# Altium footprint library Molex FFC - FPC Connectors (SMT).PcbLib: 638 footprints (part 32 of 40)
Each footprint in its own frame and in the unit in brackets; x right, y up, seen from the top. Pads: shape width x height; smd on the part's side, far side on the other; paste and mask are expansions set on the pad; w line width, h text height; cw(c..) or ccw(c..) is an arc to the next point about the centre after c.
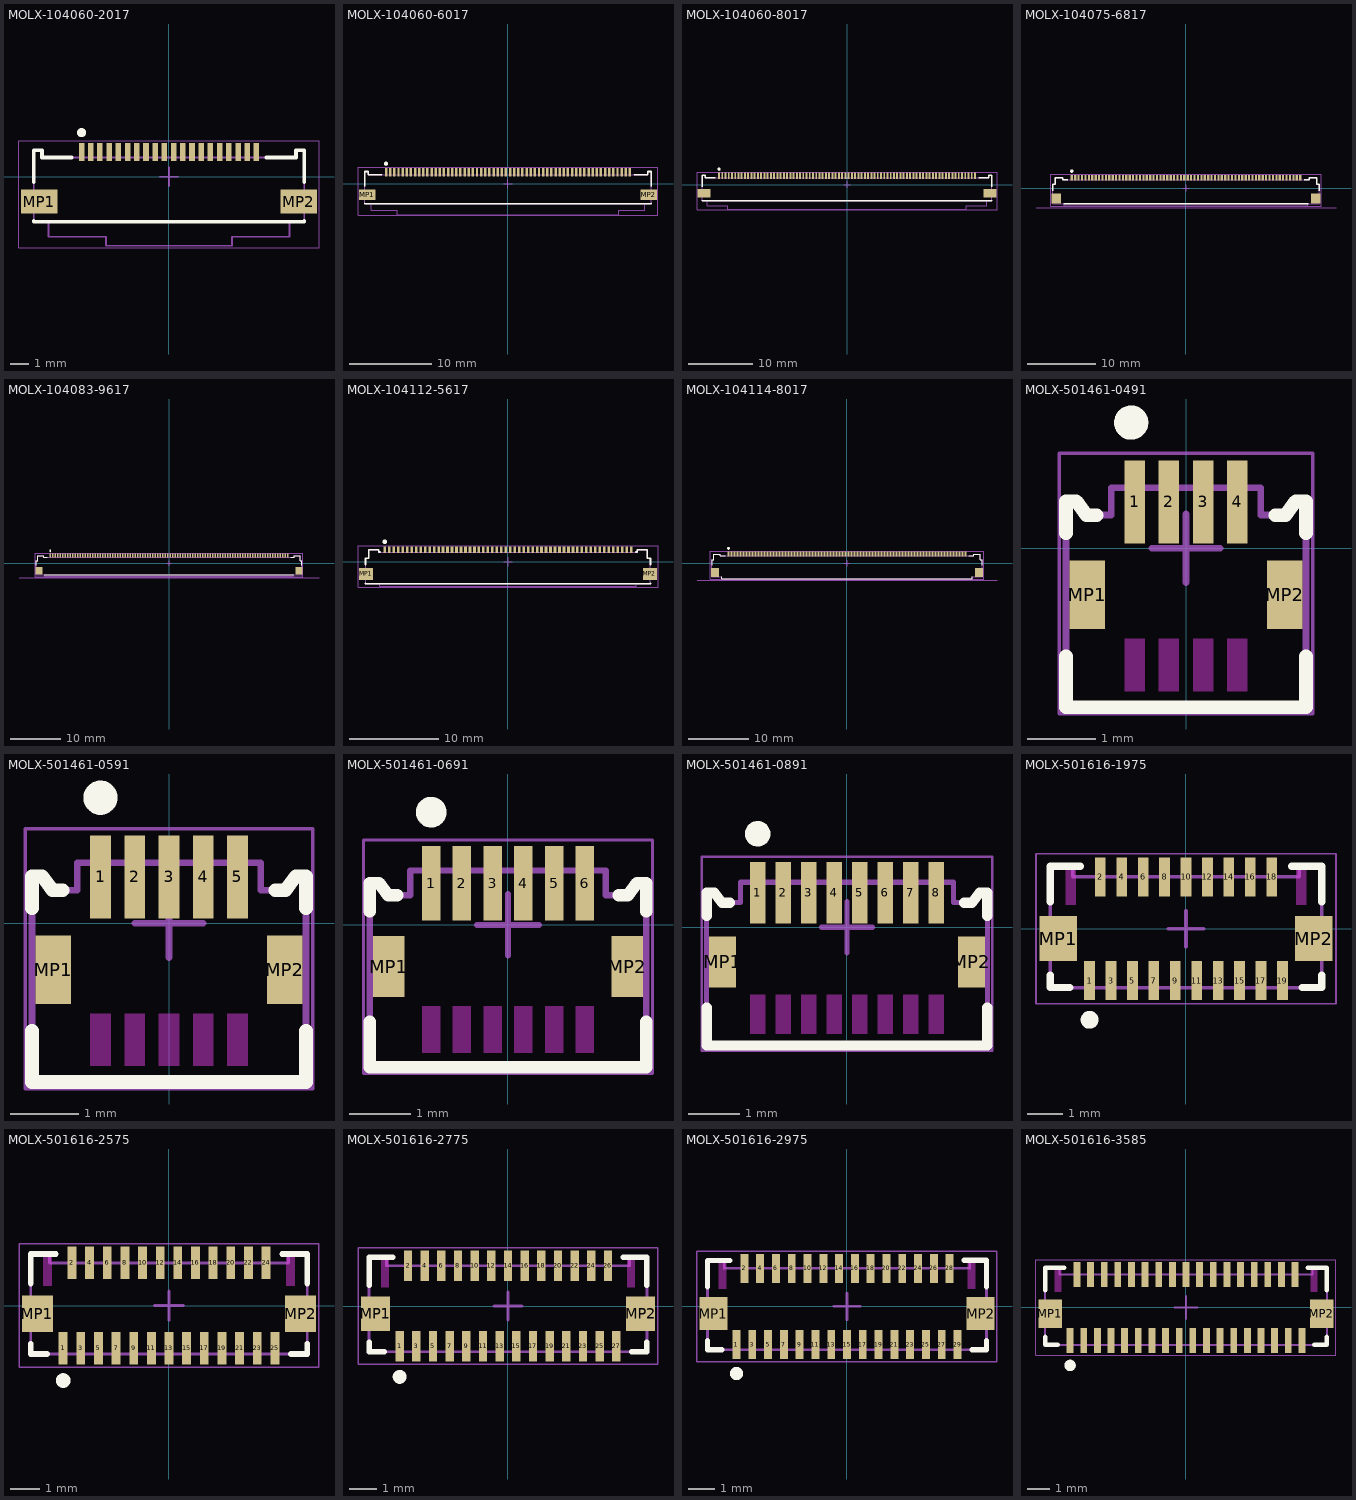
[diagram p31: the footprints below, top view; thin cyan lines are the x and y axes]

## MOLX-104060-2017 [mm] "FFC Connector, 20-Leads, Right Angle, Pitch 0.5 mm, Mated Height 2.5 mm, SMT"
height 2.55
pads (22):
  rect 0.3x1 smd: 1(-4.75,1.35) 2(-4.25,1.35) 3(-3.75,1.35) 4(-3.25,1.35) 5(-2.75,1.35) 6(-2.25,1.35) 7(-1.75,1.35) 8(-1.25,1.35) 9(-0.75,1.35) 10(-0.25,1.35) 11(0.25,1.35) 12(0.75,1.35) 13(1.25,1.35) 14(1.75,1.35) 15(2.25,1.35) 16(2.75,1.35) 17(3.25,1.35) 18(3.75,1.35) 19(4.25,1.35) 20(4.75,1.35)
  rect 2x1.3 smd: MP1(-7.05,-1.35) MP2(7.05,-1.35)
Top Overlay:
  circle w0.25: c-4.75,2.4 r0.125
  lines w0.2: -7.35,-2.4 -7.35,-2.45 7.35,-2.45 7.35,-2.4 ; -7.35,-0.3 -7.35,1.45 -6.9,1.45 -6.9,1.05 -5.3,1.05 ; 5.3,1.05 6.9,1.05 6.9,1.45 7.35,1.45 7.35,-0.3
Mechanical 13:
  lines w0.1: -6.55,-2.45 -6.55,-3.26 -3.425,-3.26 -3.425,-3.75 3.425,-3.75 3.425,-3.26 6.55,-3.26 6.55,-2.45 ; -6.55,-2.45 -7.35,-2.45 -7.35,1.45 -6.9,1.45 -6.9,1.05 6.9,1.05 6.9,1.45 7.35,1.45 7.35,-2.45 6.55,-2.45 ; -6.55,-2.45 6.55,-2.45
Mechanical 15:
  lines w0.05: -8.15,-3.85 8.15,-3.85 8.15,1.95 -8.15,1.95 -8.15,-3.85
  lines w0.1: -0.5,0 0.5,0 ; 0,-0.5 0,0.5
3D body: height 0.25, standoff 0, extent -7.75,-3.75 7.75,1.55

## MOLX-104060-6017 [mm] "FFC Connector, 60-Leads, Right Angle, Pitch 0.5 mm, Mated Height 2.5 mm, SMT"
height 2.55
pads (62):
  rect 0.3x1 smd: 1(-14.75,1.35) 2(-14.25,1.35) 3(-13.75,1.35) 4(-13.25,1.35) 5(-12.75,1.35) 6(-12.25,1.35) 7(-11.75,1.35) 8(-11.25,1.35) 9(-10.75,1.35) 10(-10.25,1.35) 11(-9.75,1.35) 12(-9.25,1.35) 13(-8.75,1.35) 14(-8.25,1.35) 15(-7.75,1.35) 16(-7.25,1.35) 17(-6.75,1.35) 18(-6.25,1.35) 19(-5.75,1.35) 20(-5.25,1.35) 21(-4.75,1.35) 22(-4.25,1.35) 23(-3.75,1.35) 24(-3.25,1.35) 25(-2.75,1.35) 26(-2.25,1.35) 27(-1.75,1.35) 28(-1.25,1.35) 29(-0.75,1.35) 30(-0.25,1.35) 31(0.25,1.35) 32(0.75,1.35) 33(1.25,1.35) 34(1.75,1.35) 35(2.25,1.35) 36(2.75,1.35) 37(3.25,1.35) 38(3.75,1.35) 39(4.25,1.35) 40(4.75,1.35) 41(5.25,1.35) 42(5.75,1.35) 43(6.25,1.35) 44(6.75,1.35) 45(7.25,1.35) 46(7.75,1.35) 47(8.25,1.35) 48(8.75,1.35) 49(9.25,1.35) 50(9.75,1.35) 51(10.25,1.35) 52(10.75,1.35) 53(11.25,1.35) 54(11.75,1.35) 55(12.25,1.35) 56(12.75,1.35) 57(13.25,1.35) 58(13.75,1.35) 59(14.25,1.35) 60(14.75,1.35)
  rect 2x1.3 smd: MP1(-17.05,-1.35) MP2(17.05,-1.35)
Top Overlay:
  circle w0.25: c-14.75,2.4 r0.125
  lines w0.2: -17.35,-2.4 -17.35,-2.45 17.35,-2.45 17.35,-2.4 ; -17.35,-0.3 -17.35,1.45 -16.9,1.45 -16.9,1.05 -15.3,1.05 ; 15.3,1.05 16.9,1.05 16.9,1.45 17.35,1.45 17.35,-0.3
Mechanical 13:
  lines w0.1: -16.55,-2.45 16.55,-2.45 ; -16.55,-2.45 -17.35,-2.45 -17.35,1.45 -16.9,1.45 -16.9,1.05 16.9,1.05 16.9,1.45 17.35,1.45 17.35,-2.45 16.55,-2.45 ; -16.55,-2.45 -16.55,-3.26 -13.425,-3.26 -13.425,-3.75 13.425,-3.75 13.425,-3.26 16.55,-3.26 16.55,-2.45
Mechanical 15:
  lines w0.05: -18.15,-3.85 18.15,-3.85 18.15,1.95 -18.15,1.95 -18.15,-3.85
  lines w0.1: -0.5,0 0.5,0 ; 0,-0.5 0,0.5
3D body: height 0.25, standoff 0, extent -17.75,-3.75 17.75,1.55

## MOLX-104060-8017 [mm] "FFC Connector, 80-Leads, Right Angle, Pitch 0.5 mm, Mated Height 2.5 mm, SMT"
height 2.55
pads (82):
  rect 0.3x1 smd: 1(-19.75,1.35) 2(-19.25,1.35) 3(-18.75,1.35) 4(-18.25,1.35) 5(-17.75,1.35) 6(-17.25,1.35) 7(-16.75,1.35) 8(-16.25,1.35) 9(-15.75,1.35) 10(-15.25,1.35) 11(-14.75,1.35) 12(-14.25,1.35) 13(-13.75,1.35) 14(-13.25,1.35) 15(-12.75,1.35) 16(-12.25,1.35) 17(-11.75,1.35) 18(-11.25,1.35) 19(-10.75,1.35) 20(-10.25,1.35) 21(-9.75,1.35) 22(-9.25,1.35) 23(-8.75,1.35) 24(-8.25,1.35) 25(-7.75,1.35) 26(-7.25,1.35) 27(-6.75,1.35) 28(-6.25,1.35) 29(-5.75,1.35) 30(-5.25,1.35) 31(-4.75,1.35) 32(-4.25,1.35) 33(-3.75,1.35) 34(-3.25,1.35) 35(-2.75,1.35) 36(-2.25,1.35) 37(-1.75,1.35) 38(-1.25,1.35) 39(-0.75,1.35) 40(-0.25,1.35) 41(0.25,1.35) 42(0.75,1.35) 43(1.25,1.35) 44(1.75,1.35) 45(2.25,1.35) 46(2.75,1.35) 47(3.25,1.35) 48(3.75,1.35) 49(4.25,1.35) 50(4.75,1.35) 51(5.25,1.35) 52(5.75,1.35) 53(6.25,1.35) 54(6.75,1.35) 55(7.25,1.35) 56(7.75,1.35) 57(8.25,1.35) 58(8.75,1.35) 59(9.25,1.35) 60(9.75,1.35) 61(10.25,1.35) 62(10.75,1.35) 63(11.25,1.35) 64(11.75,1.35) 65(12.25,1.35) 66(12.75,1.35) 67(13.25,1.35) 68(13.75,1.35) 69(14.25,1.35) 70(14.75,1.35) 71(15.25,1.35) 72(15.75,1.35) 73(16.25,1.35) 74(16.75,1.35) 75(17.25,1.35) 76(17.75,1.35) 77(18.25,1.35) 78(18.75,1.35) 79(19.25,1.35) 80(19.75,1.35)
  rect 2x1.3 smd: MP1(-22.05,-1.35) MP2(22.05,-1.35)
Top Overlay:
  circle w0.25: c-19.75,2.4 r0.125
  lines w0.2: -22.35,-2.4 -22.35,-2.45 22.35,-2.45 22.35,-2.4 ; -22.35,-0.3 -22.35,1.45 -21.9,1.45 -21.9,1.05 -20.3,1.05 ; 20.3,1.05 21.9,1.05 21.9,1.45 22.35,1.45 22.35,-0.3
Mechanical 13:
  lines w0.1: -21.55,-2.45 21.55,-2.45 ; -21.55,-2.45 -22.35,-2.45 -22.35,1.45 -21.9,1.45 -21.9,1.05 21.9,1.05 21.9,1.45 22.35,1.45 22.35,-2.45 21.55,-2.45 ; -21.55,-2.45 -21.55,-3.26 -18.425,-3.26 -18.425,-3.75 18.425,-3.75 18.425,-3.26 21.55,-3.26 21.55,-2.45
Mechanical 15:
  lines w0.05: -23.15,-3.85 -23.15,1.95 23.15,1.95 23.15,-3.85 -23.15,-3.85
  lines w0.1: -0.5,0 0.5,0 ; 0,-0.5 0,0.5
3D body: height 0.25, standoff 0, extent -22.75,-3.75 22.75,1.55

## MOLX-104075-6817 [mm] "FPC/FFC Connector, 68-Leads, Right Angle, Pitch 0.5 mm, Mated Height 1.5 mm, SMT"
height 1.5
pads (70):
  rect 0.32x0.8 smd: 1(-16.75,1.525) 2(-16.25,1.525) 3(-15.75,1.525) 4(-15.25,1.525) 5(-14.75,1.525) 6(-14.25,1.525) 7(-13.75,1.525) 8(-13.25,1.525) 9(-12.75,1.525) 10(-12.25,1.525) 11(-11.75,1.525) 12(-11.25,1.525) 13(-10.75,1.525) 14(-10.25,1.525) 15(-9.75,1.525) 16(-9.25,1.525) 17(-8.75,1.525) 18(-8.25,1.525) 19(-7.75,1.525) 20(-7.25,1.525) 21(-6.75,1.525) 22(-6.25,1.525) 23(-5.75,1.525) 24(-5.25,1.525) 25(-4.75,1.525) 26(-4.25,1.525) 27(-3.75,1.525) 28(-3.25,1.525) 29(-2.75,1.525) 30(-2.25,1.525) 31(-1.75,1.525) 32(-1.25,1.525) 33(-0.75,1.525) 34(-0.25,1.525) 35(0.25,1.525) 36(0.75,1.525) 37(1.25,1.525) 38(1.75,1.525) 39(2.25,1.525) 40(2.75,1.525) 41(3.25,1.525) 42(3.75,1.525) 43(4.25,1.525) 44(4.75,1.525) 45(5.25,1.525) 46(5.75,1.525) 47(6.25,1.525) 48(6.75,1.525) 49(7.25,1.525) 50(7.75,1.525) 51(8.25,1.525) 52(8.75,1.525) 53(9.25,1.525) 54(9.75,1.525) 55(10.25,1.525) 56(10.75,1.525) 57(11.25,1.525) 58(11.75,1.525) 59(12.25,1.525) 60(12.75,1.525) 61(13.25,1.525) 62(13.75,1.525) 63(14.25,1.525) 64(14.75,1.525) 65(15.25,1.525) 66(15.75,1.525) 67(16.25,1.525) 68(16.75,1.525)
  rect 1.4x1.5 smd: MP1(-19,-1.525) MP2(19,-1.525)
Top Overlay:
  circle w0.25: c-16.75,2.475 r0.125
  lines w0.2: -19.55,-0.375 -19.55,0.575 -19.2,0.575 -19.2,1.525 -18.09,1.525 -18.09,1.225 -17.31,1.225 ; -17.9,-2.275 -17.85,-2.275 17.85,-2.275 17.9,-2.275 ; 17.31,1.225 18.09,1.225 18.09,1.525 19.2,1.525 19.2,0.575 19.55,0.575 19.55,-0.375
Mechanical 6:
  lines w0.1: -22,-2.875 22,-2.875
  text "PCB EDGE" at -24.475,-3.025 h0.3
Mechanical 13:
  lines w0.1: -17.85,-2.275 -19.55,-2.275 -19.55,0.575 -19.2,0.575 -19.2,1.525 -18.09,1.525 -18.09,1.225 18.09,1.225 18.09,1.525 19.2,1.525 19.2,0.575 19.55,0.575 19.55,-2.275 17.85,-2.275 ; -17.85,-2.275 -17.85,-2.575 17.85,-2.575 17.85,-2.275 ; -17.85,-2.275 17.85,-2.275
Mechanical 15:
  lines w0.05: -19.8,-2.675 19.8,-2.675 19.8,2.025 -19.8,2.025 -19.8,-2.675
  lines w0.1: -0.5,0 0.5,0 ; 0,-0.5 0,0.5
3D body: height 0.25, standoff 0, extent -19.55,-2.575 19.55,1.725

## MOLX-104083-9617 [mm] "FPC/FFC Connector, 96-Leads, Right Angle, Pitch 0.5 mm, Mated Height 1.5 mm, SMT"
height 1.5
pads (98):
  rect 0.32x0.8 smd: 1(-23.75,1.525) 2(-23.25,1.525) 3(-22.75,1.525) 4(-22.25,1.525) 5(-21.75,1.525) 6(-21.25,1.525) 7(-20.75,1.525) 8(-20.25,1.525) 9(-19.75,1.525) 10(-19.25,1.525) 11(-18.75,1.525) 12(-18.25,1.525) 13(-17.75,1.525) 14(-17.25,1.525) 15(-16.75,1.525) 16(-16.25,1.525) 17(-15.75,1.525) 18(-15.25,1.525) 19(-14.75,1.525) 20(-14.25,1.525) 21(-13.75,1.525) 22(-13.25,1.525) 23(-12.75,1.525) 24(-12.25,1.525) 25(-11.75,1.525) 26(-11.25,1.525) 27(-10.75,1.525) 28(-10.25,1.525) 29(-9.75,1.525) 30(-9.25,1.525) 31(-8.75,1.525) 32(-8.25,1.525) 33(-7.75,1.525) 34(-7.25,1.525) 35(-6.75,1.525) 36(-6.25,1.525) 37(-5.75,1.525) 38(-5.25,1.525) 39(-4.75,1.525) 40(-4.25,1.525) 41(-3.75,1.525) 42(-3.25,1.525) 43(-2.75,1.525) 44(-2.25,1.525) 45(-1.75,1.525) 46(-1.25,1.525) 47(-0.75,1.525) 48(-0.25,1.525) 49(0.25,1.525) 50(0.75,1.525) 51(1.25,1.525) 52(1.75,1.525) 53(2.25,1.525) 54(2.75,1.525) 55(3.25,1.525) 56(3.75,1.525) 57(4.25,1.525) 58(4.75,1.525) 59(5.25,1.525) 60(5.75,1.525) 61(6.25,1.525) 62(6.75,1.525) 63(7.25,1.525) 64(7.75,1.525) 65(8.25,1.525) 66(8.75,1.525) 67(9.25,1.525) 68(9.75,1.525) 69(10.25,1.525) 70(10.75,1.525) 71(11.25,1.525) 72(11.75,1.525) 73(12.25,1.525) 74(12.75,1.525) 75(13.25,1.525) 76(13.75,1.525) 77(14.25,1.525) 78(14.75,1.525) 79(15.25,1.525) 80(15.75,1.525) 81(16.25,1.525) 82(16.75,1.525) 83(17.25,1.525) 84(17.75,1.525) 85(18.25,1.525) 86(18.75,1.525) 87(19.25,1.525) 88(19.75,1.525) 89(20.25,1.525) 90(20.75,1.525) 91(21.25,1.525) 92(21.75,1.525) 93(22.25,1.525) 94(22.75,1.525) 95(23.25,1.525) 96(23.75,1.525)
  rect 1.4x1.5 smd: MP1(-26,-1.525) MP2(26,-1.525)
Top Overlay:
  circle w0.25: c-23.75,2.475 r0.125
  lines w0.2: -26.55,-0.375 -26.55,0.525 -26.2,0.525 -26.2,1.525 -25.09,1.525 -25.09,1.225 -24.31,1.225 ; -24.9,-2.275 -24.85,-2.275 24.85,-2.275 24.9,-2.275 ; 24.31,1.225 25.09,1.225 25.09,1.525 26.2,1.525 26.2,0.525 26.55,0.525 26.55,-0.375
Mechanical 6:
  lines w0.1: -30,-2.875 30,-2.875
  text "PCB EDGE" at -32.75,-2.975 h0.3
Mechanical 13:
  lines w0.1: -24.85,-2.275 24.85,-2.275 ; -24.85,-2.275 -24.85,-2.575 24.85,-2.575 24.85,-2.275 ; -24.85,-2.275 -26.55,-2.275 -26.55,0.525 -26.2,0.525 -26.2,1.525 -25.09,1.525 -25.09,1.225 25.09,1.225 25.09,1.525 26.2,1.525 26.2,0.525 26.55,0.525 26.55,-2.275 24.85,-2.275
Mechanical 15:
  lines w0.05: -26.8,-2.675 -26.8,2.025 26.8,2.025 26.8,-2.675 -26.8,-2.675
  lines w0.1: -0.5,0 0.5,0 ; 0,-0.5 0,0.5
3D body: height 0.25, standoff 0, extent -26.55,-2.575 26.55,1.725

## MOLX-104112-5617 [mm] "FPC/FFC Connector, 56-Leads, Right Angle, Pitch 0.5 mm, Mated Height 1.5 mm, SMT"
height 1.5
pads (58):
  rect 0.3x0.7 smd: 1(-13.75,1.35) 2(-13.25,1.35) 3(-12.75,1.35) 4(-12.25,1.35) 5(-11.75,1.35) 6(-11.25,1.35) 7(-10.75,1.35) 8(-10.25,1.35) 9(-9.75,1.35) 10(-9.25,1.35) 11(-8.75,1.35) 12(-8.25,1.35) 13(-7.75,1.35) 14(-7.25,1.35) 15(-6.75,1.35) 16(-6.25,1.35) 17(-5.75,1.35) 18(-5.25,1.35) 19(-4.75,1.35) 20(-4.25,1.35) 21(-3.75,1.35) 22(-3.25,1.35) 23(-2.75,1.35) 24(-2.25,1.35) 25(-1.75,1.35) 26(-1.25,1.35) 27(-0.75,1.35) 28(-0.25,1.35) 29(0.25,1.35) 30(0.75,1.35) 31(1.25,1.35) 32(1.75,1.35) 33(2.25,1.35) 34(2.75,1.35) 35(3.25,1.35) 36(3.75,1.35) 37(4.25,1.35) 38(4.75,1.35) 39(5.25,1.35) 40(5.75,1.35) 41(6.25,1.35) 42(6.75,1.35) 43(7.25,1.35) 44(7.75,1.35) 45(8.25,1.35) 46(8.75,1.35) 47(9.25,1.35) 48(9.75,1.35) 49(10.25,1.35) 50(10.75,1.35) 51(11.25,1.35) 52(11.75,1.35) 53(12.25,1.35) 54(12.75,1.35) 55(13.25,1.35) 56(13.75,1.35)
  rect 1.6x1.3 smd: MP1(-15.85,-1.35) MP2(15.85,-1.35)
Top Overlay:
  circle w0.25: c-13.75,2.25 r0.125
  lines w0.2: -15.9,-2.4 -15.9,-2.45 -14.3,-2.45 14.3,-2.45 15.9,-2.45 15.9,-2.4 ; -15.9,-0.3 -15.9,0.4 -15.55,0.4 -15.55,1.35 -14.44,1.35 -14.44,1.1 -14.3,1.1 ; 14.3,1.1 14.44,1.1 14.44,1.35 15.55,1.35 15.55,0.4 15.9,0.4 15.9,-0.3
Mechanical 13:
  lines w0.1: -14.3,-2.45 -15.9,-2.45 -15.9,0.4 -15.55,0.4 -15.55,1.35 -14.44,1.35 -14.44,1.1 14.44,1.1 14.44,1.35 15.55,1.35 15.55,0.4 15.9,0.4 15.9,-2.45 14.3,-2.45 ; -14.3,-2.45 -14.3,-2.75 14.3,-2.75 14.3,-2.45 ; -14.3,-2.45 14.3,-2.45
Mechanical 15:
  lines w0.05: -16.75,-2.85 -16.75,1.8 16.75,1.8 16.75,-2.85 -16.75,-2.85
  lines w0.1: -0.5,0 0.5,0 ; 0,-0.5 0,0.5
3D body: height 0.25, standoff 0, extent -16.26,-2.75 16.26,1.6

## MOLX-104114-8017 [mm] "FPC/FFC Connector, 80-Leads, Right Angle, Pitch 0.5 mm, Mated Height 1.5 mm, SMT"
height 1.5
pads (82):
  rect 0.32x0.8 smd: 1(-19.75,1.525) 2(-19.25,1.525) 3(-18.75,1.525) 4(-18.25,1.525) 5(-17.75,1.525) 6(-17.25,1.525) 7(-16.75,1.525) 8(-16.25,1.525) 9(-15.75,1.525) 10(-15.25,1.525) 11(-14.75,1.525) 12(-14.25,1.525) 13(-13.75,1.525) 14(-13.25,1.525) 15(-12.75,1.525) 16(-12.25,1.525) 17(-11.75,1.525) 18(-11.25,1.525) 19(-10.75,1.525) 20(-10.25,1.525) 21(-9.75,1.525) 22(-9.25,1.525) 23(-8.75,1.525) 24(-8.25,1.525) 25(-7.75,1.525) 26(-7.25,1.525) 27(-6.75,1.525) 28(-6.25,1.525) 29(-5.75,1.525) 30(-5.25,1.525) 31(-4.75,1.525) 32(-4.25,1.525) 33(-3.75,1.525) 34(-3.25,1.525) 35(-2.75,1.525) 36(-2.25,1.525) 37(-1.75,1.525) 38(-1.25,1.525) 39(-0.75,1.525) 40(-0.25,1.525) 41(0.25,1.525) 42(0.75,1.525) 43(1.25,1.525) 44(1.75,1.525) 45(2.25,1.525) 46(2.75,1.525) 47(3.25,1.525) 48(3.75,1.525) 49(4.25,1.525) 50(4.75,1.525) 51(5.25,1.525) 52(5.75,1.525) 53(6.25,1.525) 54(6.75,1.525) 55(7.25,1.525) 56(7.75,1.525) 57(8.25,1.525) 58(8.75,1.525) 59(9.25,1.525) 60(9.75,1.525) 61(10.25,1.525) 62(10.75,1.525) 63(11.25,1.525) 64(11.75,1.525) 65(12.25,1.525) 66(12.75,1.525) 67(13.25,1.525) 68(13.75,1.525) 69(14.25,1.525) 70(14.75,1.525) 71(15.25,1.525) 72(15.75,1.525) 73(16.25,1.525) 74(16.75,1.525) 75(17.25,1.525) 76(17.75,1.525) 77(18.25,1.525) 78(18.75,1.525) 79(19.25,1.525) 80(19.75,1.525)
  rect 1.4x1.5 smd: MP1(-22,-1.525) MP2(22,-1.525)
Top Overlay:
  circle w0.25: c-19.75,2.475 r0.125
  lines w0.2: -22.55,-0.375 -22.55,0.575 -22.2,0.575 -22.2,1.525 -21.09,1.525 -21.09,1.225 -20.31,1.225 ; -20.9,-2.275 -20.85,-2.275 -20.85,-2.575 20.85,-2.575 20.85,-2.275 20.9,-2.275 ; 20.31,1.225 21.09,1.225 21.09,1.525 22.2,1.525 22.2,0.575 22.55,0.575 22.55,-0.375
Mechanical 6:
  lines w0.1: -25,-2.875 25,-2.875
  text "PCB EDGE" at -27.75,-2.975 h0.3
Mechanical 13:
  lines w0.1: -22.55,-2.275 -20.85,-2.275 -20.85,-2.575 20.85,-2.575 20.85,-2.275 22.55,-2.275 22.55,0.575 22.2,0.575 22.2,1.525 21.09,1.525 21.09,1.225 -21.09,1.225 -21.09,1.525 -22.2,1.525 -22.2,0.575 -22.55,0.575 -22.55,-2.275
Mechanical 15:
  lines w0.05: -22.8,-2.675 -22.8,2.025 22.8,2.025 22.8,-2.675 -22.8,-2.675
  lines w0.1: -0.5,0 0.5,0 ; 0,-0.5 0,0.5
3D body: height 0.25, standoff 0, extent -22.55,-2.575 22.55,1.725

## MOLX-501461-0491 [mm] "FPC Connector, 4-Leads, Right Angle, Pitch 0.5 mm, Mated Height 0.8 mm, SMT"
height 0.812
pads (6):
  rect 0.3x1.21 smd: 1(-0.75,0.678) 2(-0.25,0.678) 3(0.25,0.678) 4(0.75,0.678)
  rect 0.52x1 smd: MP1(-1.44,-0.677) MP2(1.44,-0.677)
Top Overlay:
  circle w0.25: c-0.8,1.833 r0.125
  lines w0.2: -1.75,-1.574 -1.75,-2.318 1.75,-2.318 1.75,-1.574 ; -1.75,0.219 -1.75,0.682 -1.6,0.682 -1.45,0.482 -1.3,0.482 ; 1.3,0.482 1.45,0.482 1.6,0.682 1.75,0.682 1.75,0.219
Keep-Out Layer:
  rectangle: 0.6,-2.087 0.9,-1.318
  rectangle: 0.1,-2.087 0.4,-1.318
  rectangle: -0.4,-2.087 -0.1,-1.318
  rectangle: -0.9,-2.087 -0.6,-1.318
Mechanical 13:
  lines w0.1: -1.75,0.68 -1.75,-2.318 1.75,-2.318 1.75,0.682 1.6,0.682 1.45,0.482 1.09,0.482 1.09,0.882 -1.09,0.882 -1.09,0.482 -1.45,0.482 -1.6,0.682 -1.75,0.682
Mechanical 15:
  lines w0.05: -1.85,-2.418 -1.85,1.382 1.85,1.382 1.85,-2.418 -1.85,-2.418
  lines w0.1: -0.5,0 0.5,0 ; 0,-0.5 0,0.5
3D body: height 0.25, standoff 0, extent -1.75,-2.318 1.75,0.882

## MOLX-501461-0591 [mm] "FPC Connector, 5-Leads, Right Angle, Pitch 0.5 mm, Mated Height 0.8 mm, SMT"
height 0.812
pads (7):
  rect 0.3x1.21 smd: 1(-1,0.678) 2(-0.5,0.678) 3(0,0.678) 4(0.5,0.678) 5(1,0.677)
  rect 0.52x1 smd: MP1(-1.69,-0.677) MP2(1.69,-0.677)
Top Overlay:
  circle w0.25: c-1,1.833 r0.125
  lines w0.2: -2,-1.574 -2,-2.318 2,-2.318 2,-1.574 ; -2,0.219 -2,0.682 -1.85,0.682 -1.7,0.482 -1.55,0.482 ; 1.55,0.482 1.7,0.482 1.85,0.682 2,0.682 2,0.219
Keep-Out Layer:
  rectangle: 0.85,-2.087 1.15,-1.318
  rectangle: 0.35,-2.087 0.65,-1.318
  rectangle: -0.15,-2.087 0.15,-1.318
  rectangle: -0.65,-2.087 -0.35,-1.318
  rectangle: -1.15,-2.087 -0.85,-1.318
Mechanical 13:
  lines w0.1: -2,-2.318 -2,0.682 -1.85,0.682 -1.7,0.482 -1.34,0.482 -1.34,0.882 1.34,0.882 1.34,0.482 1.7,0.482 1.85,0.682 2,0.682 2,-2.318 -2,-2.318
Mechanical 15:
  lines w0.05: -2.1,-2.418 -2.1,1.382 2.1,1.382 2.1,-2.418 -2.1,-2.418
  lines w0.1: -0.5,0 0.5,0 ; 0,-0.5 0,0.5
3D body: height 0.25, standoff 0, extent -2,-2.317 2,0.883

## MOLX-501461-0691 [mm] "FPC Connector, 6-Leads, Right Angle, Pitch 0.5 mm, Mated Height 0.8 mm, SMT"
height 0.812
pads (8):
  rect 0.3x1.21 smd: 1(-1.25,0.678) 2(-0.75,0.678) 3(-0.25,0.678) 4(0.25,0.678) 5(0.75,0.677) 6(1.25,0.677)
  rect 0.52x1 smd: MP1(-1.94,-0.677) MP2(1.94,-0.677)
Top Overlay:
  circle w0.25: c-1.25,1.833 r0.125
  lines w0.2: -2.25,-1.574 -2.25,-2.318 2.25,-2.318 2.25,-1.574 ; -2.25,0.219 -2.25,0.682 -2.1,0.682 -1.95,0.482 -1.8,0.482 ; 1.8,0.482 1.95,0.482 2.1,0.682 2.25,0.682 2.25,0.219
Keep-Out Layer:
  rectangle: 0.6,-2.087 0.9,-1.318
  rectangle: 0.1,-2.087 0.4,-1.318
  rectangle: -0.4,-2.087 -0.1,-1.318
  rectangle: -0.9,-2.087 -0.6,-1.318
  rectangle: -1.4,-2.087 -1.1,-1.318
  rectangle: 1.1,-2.087 1.4,-1.318
Mechanical 13:
  lines w0.1: -2.25,-2.318 -2.25,0.682 -2.1,0.682 -1.95,0.482 -1.59,0.482 -1.59,0.882 1.59,0.882 1.59,0.482 1.95,0.482 2.1,0.682 2.25,0.682 2.25,-2.318 -2.25,-2.318
Mechanical 15:
  lines w0.05: -2.35,-2.418 -2.35,1.382 2.35,1.382 2.35,-2.418 -2.35,-2.418
  lines w0.1: -0.5,0 0.5,0 ; 0,-0.5 0,0.5
3D body: height 0.25, standoff 0, extent -2.25,-2.318 2.25,0.882

## MOLX-501461-0891 [mm] "FPC Connector, 8-Leads, Right Angle, Pitch 0.5 mm, Mated Height 0.8 mm, SMT"
height 0.812
pads (10):
  rect 0.3x1.21 smd: 1(-1.75,0.678) 2(-1.25,0.678) 3(-0.75,0.678) 4(-0.25,0.678) 5(0.25,0.677) 6(0.75,0.677) 7(1.25,0.677) 8(1.75,0.677)
  rect 0.52x1 smd: MP1(-2.44,-0.677) MP2(2.44,-0.677)
Top Overlay:
  circle w0.25: c-1.75,1.833 r0.125
  lines w0.2: -2.75,-1.574 -2.75,-2.318 2.75,-2.318 2.75,-1.574 ; -2.75,0.219 -2.75,0.682 -2.6,0.682 -2.45,0.482 -2.3,0.482 ; 2.3,0.482 2.45,0.482 2.6,0.682 2.75,0.682 2.75,0.219
Keep-Out Layer:
  rectangle: 0.6,-2.087 0.9,-1.318
  rectangle: -1.9,-2.087 -1.6,-1.318
  rectangle: -1.4,-2.087 -1.1,-1.318
  rectangle: -0.9,-2.087 -0.6,-1.318
  rectangle: -0.4,-2.087 -0.1,-1.318
  rectangle: 0.1,-2.087 0.4,-1.318
  rectangle: 1.1,-2.087 1.4,-1.318
  rectangle: 1.6,-2.087 1.9,-1.318
Mechanical 13:
  lines w0.1: -2.75,-2.318 2.75,-2.318 2.75,0.682 2.6,0.682 2.45,0.482 2.09,0.482 2.09,0.882 -2.09,0.882 -2.09,0.482 -2.45,0.482 -2.6,0.682 -2.75,0.682 -2.75,-2.318
Mechanical 15:
  lines w0.05: -2.85,-2.418 2.85,-2.418 2.85,1.382 -2.85,1.382 -2.85,-2.418
  lines w0.1: -0.5,0 0.5,0 ; 0,-0.5 0,0.5
3D body: height 0.25, standoff 0, extent -2.75,-2.318 2.75,0.882

## MOLX-501616-1975 [mm] "FPC Connector, 19-Leads, Right Angle, Pitch 0.3 mm, Mated Height 1.1 mm, SMT"
height 1.112
pads (21):
  rect 0.3x1.1 smd: 1(-2.7,-1.45) 2(-2.4,1.45) 3(-2.1,-1.45) 4(-1.8,1.45) 5(-1.5,-1.45) 6(-1.2,1.45) 7(-0.9,-1.45) 8(-0.6,1.45) 9(-0.3,-1.45) 10(0,1.45) 11(0.3,-1.45) 12(0.6,1.45) 13(0.9,-1.45) 14(1.2,1.45) 15(1.5,-1.45) 16(1.8,1.45) 17(2.1,-1.45) 18(2.4,1.45) 19(2.7,-1.45)
  rect 1.05x1.25 smd: MP1(-3.575,-0.275) MP2(3.575,-0.275)
Top Overlay:
  circle w0.25: c-2.7,-2.55 r0.125
  lines w0.2: -3.8,-1.3 -3.8,-1.65 -3.25,-1.65 ; -3.8,0.75 -3.8,1.75 -2.95,1.75 ; 2.95,1.75 3.8,1.75 3.8,0.75 ; 3.25,-1.65 3.8,-1.65 3.8,-1.3
Keep-Out Layer:
  rectangle: -3.38,0.67 -3.08,1.78
  rectangle: 3.08,0.67 3.38,1.78
Mechanical 13:
  lines w0.1: -3.8,-1.65 3.8,-1.65 3.8,1.75 3.17,1.75 3.17,1.45 -3.17,1.45 -3.17,1.75 -3.8,1.75 -3.8,-1.65
Mechanical 15:
  lines w0.05: -4.2,-2.1 -4.2,2.1 4.2,2.1 4.2,-2.1 -4.2,-2.1
  lines w0.1: -0.5,0 0.5,0 ; 0,-0.5 0,0.5
3D body: height 0.25, standoff 0, extent -3.8,-1.7 3.8,1.75

## MOLX-501616-2575 [mm] "FPC Connector, 25-Leads, Right Angle, Pitch 0.3 mm, Mated Height 1.1 mm, SMT"
height 1.112
pads (27):
  rect 0.3x1.1 smd: 1(-3.6,-1.45) 2(-3.3,1.45) 3(-3,-1.45) 4(-2.7,1.45) 5(-2.4,-1.45) 6(-2.1,1.45) 7(-1.8,-1.45) 8(-1.5,1.45) 9(-1.2,-1.45) 10(-0.9,1.45) 11(-0.6,-1.45) 12(-0.3,1.45) 13(0,-1.45) 14(0.3,1.45) 15(0.6,-1.45) 16(0.9,1.45) 17(1.2,-1.45) 18(1.5,1.45) 19(1.8,-1.45) 20(2.1,1.45) 21(2.4,-1.45) 22(2.7,1.45) 23(3,-1.45) 24(3.3,1.45) 25(3.6,-1.45)
  rect 1.05x1.25 smd: MP1(-4.475,-0.275) MP2(4.475,-0.275)
Top Overlay:
  circle w0.25: c-3.6,-2.55 r0.125
  lines w0.2: -4.7,-1.65 -4.7,-1.3 ; -4.7,0.75 -4.7,1.75 -3.85,1.75 ; -4.7,-1.65 -4.15,-1.65 ; 3.85,1.75 4.7,1.75 4.7,0.75 ; 4.15,-1.65 4.7,-1.65 4.7,-1.3
Keep-Out Layer:
  rectangle: 3.98,0.67 4.28,1.78
  rectangle: -4.28,0.67 -3.98,1.78
Mechanical 13:
  lines w0.1: -4.7,-1.65 -4.7,1.75 -4.07,1.75 -4.07,1.45 4.07,1.45 4.07,1.75 4.7,1.75 4.7,-1.65 -4.7,-1.65
Mechanical 15:
  lines w0.05: -5.1,-2.1 5.1,-2.1 5.1,2.1 -5.1,2.1 -5.1,-2.1
  lines w0.1: -0.5,0 0.5,0 ; 0,-0.5 0,0.5
3D body: height 0.25, standoff 0, extent -4.7,-1.7 4.7,1.75

## MOLX-501616-2775 [mm] "FPC Connector, 27-Leads, Right Angle, Pitch 0.3 mm, Mated Height 1.1 mm, SMT"
height 1.112
pads (29):
  rect 0.3x1.1 smd: 1(-3.9,-1.45) 2(-3.6,1.45) 3(-3.3,-1.45) 4(-3,1.45) 5(-2.7,-1.45) 6(-2.4,1.45) 7(-2.1,-1.45) 8(-1.8,1.45) 9(-1.5,-1.45) 10(-1.2,1.45) 11(-0.9,-1.45) 12(-0.6,1.45) 13(-0.3,-1.45) 14(0,1.45) 15(0.3,-1.45) 16(0.6,1.45) 17(0.9,-1.45) 18(1.2,1.45) 19(1.5,-1.45) 20(1.8,1.45) 21(2.1,-1.45) 22(2.4,1.45) 23(2.7,-1.45) 24(3,1.45) 25(3.3,-1.45) 26(3.6,1.45) 27(3.9,-1.45)
  rect 1.05x1.25 smd: MP1(-4.775,-0.275) MP2(4.775,-0.275)
Top Overlay:
  circle w0.25: c-3.9,-2.55 r0.125
  lines w0.2: -5,-1.3 -5,-1.65 -4.45,-1.65 ; -5,0.75 -5,1.75 -4.15,1.75 ; 4.15,1.75 5,1.75 5,0.75 ; 4.45,-1.65 5,-1.65 5,-1.3
Keep-Out Layer:
  rectangle: 4.28,0.67 4.58,1.78
  rectangle: -4.58,0.67 -4.28,1.78
Mechanical 13:
  lines w0.1: -5,-1.65 -5,1.75 -4.37,1.75 -4.37,1.45 4.37,1.45 4.37,1.75 5,1.75 5,-1.65 -5,-1.65
Mechanical 15:
  lines w0.05: -5.4,-2.1 5.4,-2.1 5.4,2.1 -5.4,2.1 -5.4,-2.1
  lines w0.1: -0.5,0 0.5,0 ; 0,-0.5 0,0.5
3D body: height 0.25, standoff 0, extent -5,-1.699 5.001,1.75

## MOLX-501616-2975 [mm] "FPC Connector, 29-Leads, Right Angle, Pitch 0.3 mm, Mated Height 1.1 mm, SMT"
height 1.112
pads (31):
  rect 0.3x1.1 smd: 1(-4.2,-1.45) 2(-3.9,1.45) 3(-3.6,-1.45) 4(-3.3,1.45) 5(-3,-1.45) 6(-2.7,1.45) 7(-2.4,-1.45) 8(-2.1,1.45) 9(-1.8,-1.45) 10(-1.5,1.45) 11(-1.2,-1.45) 12(-0.9,1.45) 13(-0.6,-1.45) 14(-0.3,1.45) 15(0,-1.45) 16(0.3,1.45) 17(0.6,-1.45) 18(0.9,1.45) 19(1.2,-1.45) 20(1.5,1.45) 21(1.8,-1.45) 22(2.1,1.45) 23(2.4,-1.45) 24(2.7,1.45) 25(3,-1.45) 26(3.3,1.45) 27(3.6,-1.45) 28(3.9,1.45) 29(4.2,-1.45)
  rect 1.05x1.25 smd: MP1(-5.075,-0.275) MP2(5.075,-0.275)
Top Overlay:
  circle w0.25: c-4.2,-2.55 r0.125
  lines w0.2: -5.3,-1.3 -5.3,-1.65 -4.75,-1.65 ; -5.3,0.75 -5.3,1.75 -4.45,1.75 ; 4.45,1.75 5.3,1.75 5.3,0.75 ; 4.75,-1.65 5.3,-1.65 5.3,-1.3
Keep-Out Layer:
  rectangle: -4.88,0.67 -4.58,1.78
  rectangle: 4.58,0.67 4.88,1.78
Mechanical 13:
  lines w0.1: -5.3,-1.65 5.3,-1.65 5.3,1.75 4.67,1.75 4.67,1.45 -4.67,1.45 -4.67,1.75 -5.3,1.75 -5.3,-1.65
Mechanical 15:
  lines w0.05: -5.7,-2.1 -5.7,2.1 5.7,2.1 5.7,-2.1 -5.7,-2.1
  lines w0.1: -0.5,0 0.5,0 ; 0,-0.5 0,0.5
3D body: height 0.25, standoff 0, extent -5.3,-1.7 5.3,1.75

## MOLX-501616-3585 [mm] "FPC Connector, 35-Leads, Right Angle, Pitch 0.3 mm, Mated Height 1.1 mm, SMT"
height 1.112
pads (37):
  rect 0.3x1.1 smd: 1(-5.1,-1.45) 2(-4.8,1.45) 3(-4.5,-1.45) 4(-4.2,1.45) 5(-3.9,-1.45) 6(-3.6,1.45) 7(-3.3,-1.45) 8(-3,1.45) 9(-2.7,-1.45) 10(-2.4,1.45) 11(-2.1,-1.45) 12(-1.8,1.45) 13(-1.5,-1.45) 14(-1.2,1.45) 15(-0.9,-1.45) 16(-0.6,1.45) 17(-0.3,-1.45) 18(0,1.45) 19(0.3,-1.45) 20(0.6,1.45) 21(0.9,-1.45) 22(1.2,1.45) 23(1.5,-1.45) 24(1.8,1.45) 25(2.1,-1.45) 26(2.4,1.45) 27(2.7,-1.45) 28(3,1.45) 29(3.3,-1.45) 30(3.6,1.45) 31(3.9,-1.45) 32(4.2,1.45) 33(4.5,-1.45) 34(4.8,1.45) 35(5.1,-1.45)
  rect 1.05x1.25 smd: MP1(-5.975,-0.275) MP2(5.975,-0.275)
Top Overlay:
  circle w0.25: c-5.1,-2.55 r0.125
  lines w0.2: -6.2,-1.3 -6.2,-1.65 -5.65,-1.65 ; -6.2,0.75 -6.2,1.75 -5.35,1.75 ; 5.35,1.75 6.2,1.75 6.2,0.75 ; 5.65,-1.65 6.2,-1.65 6.2,-1.3
Keep-Out Layer:
  rectangle: 5.48,0.67 5.78,1.78
  rectangle: -5.78,0.67 -5.48,1.78
Mechanical 13:
  lines w0.1: -6.2,-1.65 -6.2,1.75 -5.57,1.75 -5.57,1.45 5.57,1.45 5.57,1.75 6.2,1.75 6.2,-1.65 -6.2,-1.65
Mechanical 15:
  lines w0.05: -6.6,-2.1 6.6,-2.1 6.6,2.1 -6.6,2.1 -6.6,-2.1
  lines w0.1: -0.5,0 0.5,0 ; 0,-0.5 0,0.5
3D body: height 0.25, standoff 0, extent -6.2,-1.7 6.2,1.75